# Altium footprint library CADTchip.PcbLib: 195 footprints (part 2 of 13)
Each footprint in its own frame and in the unit in brackets; x right, y up, seen from the top. Pads: shape width x height; smd on the part's side, far side on the other; paste and mask are expansions set on the pad; w line width, h text height; cw(c..) or ccw(c..) is an arc to the next point about the centre after c.
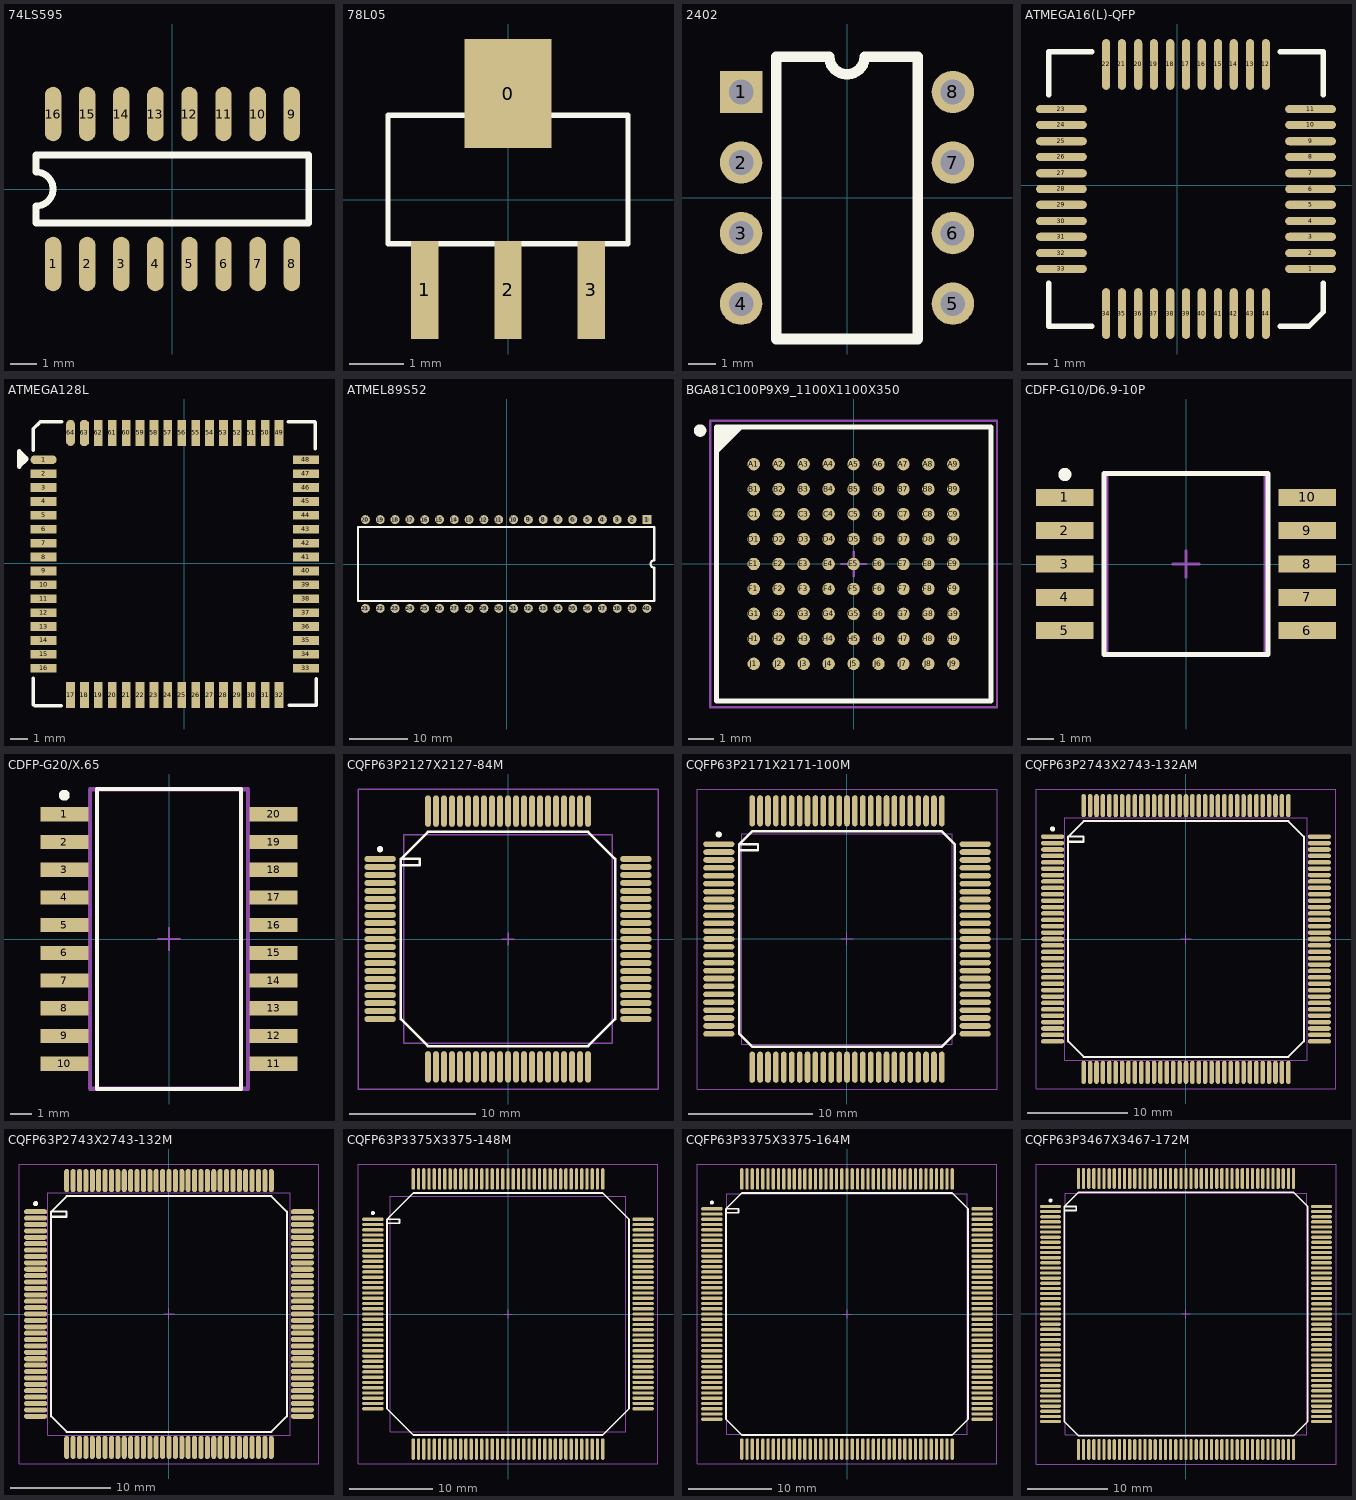
[diagram p1: the footprints below, top view; thin cyan lines are the x and y axes]

## 74LS595 [mil]
pads (16):
  oval 24x80 smd: 1(-175,-110) 2(-125,-110) 3(-75,-110) 4(-25,-110) 5(25,-110) 6(75,-110) 7(125,-110) 8(175,-110) 9(175,110) 10(125,110) 11(75,110) 12(25,110) 13(-25,110) 14(-75,110) 15(-125,110) 16(-175,110)
Top Overlay:
  lines w10: -200,-50 200,-50 200,50 -200,50 -200,25 cw(c-200,0) -200,-25 -200,-50

## 78L05 [mm]
pads (4):
  rect 1.6x2 smd: 0(-0.001,1.949)
  rect 0.5x1.8 smd: 1(-1.525,-1.651) 2(-0.001,-1.651) 3(1.523,-1.651)
Top Overlay:
  lines w0.1: -2.201,-0.801 2.199,-0.801 2.199,1.549 -2.201,1.549 -2.201,-0.801

## 2402 [mil] "DIP-8"
pads (8):
  rect 60x60 hole 35: 1(-150,150)
  round 60 hole 35: 2(-150,50) 3(-150,-50) 4(-150,-150) 5(150,-150) 6(150,-50) 7(150,50) 8(150,150)
Top Overlay:
  lines w15: -100,-200 100,-200 100,200 25,200 cw(c0,200) -25,200 -100,200 -100,-200

## ATMEGA16(L)-QFP [mil]
pads (44):
  oval 100x16 smd: 1(262.47,-164.14) 2(262.47,-133.14) 3(262.47,-101.14) 4(262.47,-70.14) 5(262.47,-38.14) 6(262.47,-7.14) 7(262.47,23.86) 8(262.47,55.86) 9(262.47,86.86) 10(262.47,118.86) 11(262.47,149.86) 23(-227.53,149.86) 24(-227.53,118.86) 25(-227.53,86.86) 26(-227.53,55.86) 27(-227.53,23.86) 28(-227.53,-7.14) 29(-227.53,-38.14) 30(-227.53,-70.14) 31(-227.53,-101.14) 32(-227.53,-133.14) 33(-227.53,-164.14)
  oval 16x100 smd: 12(174.47,237.86) 13(143.47,237.86) 14(111.47,237.86) 15(80.47,237.86) 16(48.47,237.86) 17(17.47,237.86) 18(-13.53,237.86) 19(-45.53,237.86) 20(-76.53,237.86) 21(-108.53,237.86) 22(-139.53,237.86) 34(-139.53,-252.14) 35(-108.53,-252.14) 36(-76.53,-252.14) 37(-45.53,-252.14) 38(-13.53,-252.14) 39(17.47,-252.14) 40(48.47,-252.14) 41(80.47,-252.14) 42(111.47,-252.14) 43(143.47,-252.14) 44(174.47,-252.14)
Top Overlay:
  lines w10: -252.53,-192.14 -252.53,-277.14 -167.53,-277.14 ; -252.53,177.86 -252.53,262.86 -167.53,262.86 ; 202.47,-277.14 259.47,-277.14 287.47,-249.14 287.47,-192.14 ; 202.47,262.86 287.47,262.86 287.47,177.86

## ATMEGA128L [mm]
pads (64):
  oval 1.5x0.5 smd: 1(-8.084,5.96)
  rect 1.5x0.5 smd: 2(-8.084,5.16) 3(-8.084,4.36) 4(-8.084,3.56) 5(-8.084,2.76) 6(-8.084,1.96) 7(-8.084,1.16) 8(-8.084,0.36) 9(-8.084,-0.44) 10(-8.084,-1.24) 11(-8.084,-2.04) 12(-8.084,-2.84) 13(-8.084,-3.64) 14(-8.084,-4.44) 15(-8.084,-5.24) 16(-8.084,-6.04) 33(7.016,-6.04) 34(7.016,-5.24) 35(7.016,-4.44) 36(7.016,-3.64) 37(7.016,-2.84) 38(7.016,-2.04) 39(7.016,-1.24) 40(7.016,-0.44) 41(7.016,0.36) 42(7.016,1.16) 43(7.016,1.96) 44(7.016,2.76) 45(7.016,3.56) 46(7.016,4.36) 47(7.016,5.16) 48(7.016,5.96)
  rect 0.5x1.5 smd: 17(-6.534,-7.59) 18(-5.734,-7.59) 19(-4.934,-7.59) 20(-4.134,-7.59) 21(-3.334,-7.59) 22(-2.534,-7.59) 23(-1.734,-7.59) 24(-0.934,-7.59) 25(-0.134,-7.59) 26(0.666,-7.59) 27(1.466,-7.59) 28(2.266,-7.59) 29(3.066,-7.59) 30(3.866,-7.59) 31(4.666,-7.59) 32(5.466,-7.59) 49(5.466,7.51) 50(4.666,7.51) 51(3.866,7.51) 52(3.066,7.51) 53(2.266,7.51) 54(1.466,7.51) 55(0.666,7.51) 56(-0.134,7.51) 57(-0.934,7.51) 58(-1.734,7.51) 59(-2.534,7.51) 60(-3.334,7.51) 61(-4.134,7.51) 62(-4.934,7.51)
  oct 0.5x1.5 smd: 63(-5.734,7.51)
  oval 0.5x1.5 smd: 64(-6.534,7.51)
Top Overlay:
  lines w0.2: -8.671,-8.131 -8.671,-6.606 ; -8.671,6.499 -8.671,7.749 ; -8.616,7.799 -8.341,8.074 ; -8.595,-8.207 -7.07,-8.207 ; -8.29,8.15 -7.04,8.15 ; 6.009,8.15 7.534,8.15 ; 6.06,-8.182 7.585,-8.182 ; 7.56,6.6 7.56,8.125 ; 7.61,-8.157 7.61,-6.632
  lines w0.254: -9.498,5.571 -9.077,5.991 ; -9.494,6.458 -9.073,6.037 ; -9.484,5.559 -9.484,6.457 ; -9.322,6.017 -9.154,6.017

## ATMEL89S52 [mil]
pads (40):
  rect 60x60 hole 33: 1(946.17,300)
  round 60 hole 33: 2(846.17,300) 3(746.17,300) 4(646.17,300) 5(546.17,300) 6(446.17,300) 7(346.17,300) 8(246.17,300) 9(146.17,300) 10(46.17,300) 11(-53.83,300) 12(-153.83,300) 13(-253.83,300) 14(-353.83,300) 15(-453.83,300) 16(-553.83,300) 17(-653.83,300) 18(-753.83,300) 19(-853.83,300) 20(-953.83,300) 21(-953.83,-300) 22(-853.83,-300) 23(-753.83,-300) 24(-653.83,-300) 25(-553.83,-300) 26(-453.83,-300) 27(-353.83,-300) 28(-253.83,-300) 29(-153.83,-300) 30(-53.83,-300) 31(46.17,-300) 32(146.17,-300) 33(246.17,-300) 34(346.17,-300) 35(446.17,-300) 36(546.17,-300) 37(646.17,-300) 38(746.17,-300) 39(846.17,-300) 40(946.17,-300)
Top Overlay:
  lines w15: -1003.83,-250 996.17,-250 996.17,-25 cw(c996.17,0) 996.17,25 996.17,250 -1003.83,250 -1003.83,-250

## BGA81C100P9X9_1100X1100X350 [mm] "BGA, 81-Leads, Body 11.0x11.0mm,  Pitch 1.00mm"
height 3.5
pads (81):
  round 0.5 smd: A1(-4,4) A2(-3,4) A3(-2,4) A4(-1,4) A5(0,4) A6(1,4) A7(2,4) A8(3,4) A9(4,4) B1(-4,3) B2(-3,3) B3(-2,3) B4(-1,3) B5(0,3) B6(1,3) B7(2,3) B8(3,3) B9(4,3) C1(-4,2) C2(-3,2) C3(-2,2) C4(-1,2) C5(0,2) C6(1,2) C7(2,2) C8(3,2) C9(4,2) D1(-4,1) D2(-3,1) D3(-2,1) D4(-1,1) D5(0,1) D6(1,1) D7(2,1) D8(3,1) D9(4,1) E1(-4,0) E2(-3,0) E3(-2,0) E4(-1,0) E5(0,0) E6(1,0) E7(2,0) E8(3,0) E9(4,0) F1(-4,-1) F2(-3,-1) F3(-2,-1) F4(-1,-1) F5(0,-1) F6(1,-1) F7(2,-1) F8(3,-1) F9(4,-1) G1(-4,-2) G2(-3,-2) G3(-2,-2) G4(-1,-2) G5(0,-2) G6(1,-2) G7(2,-2) G8(3,-2) G9(4,-2) H1(-4,-3) H2(-3,-3) H3(-2,-3) H4(-1,-3) H5(0,-3) H6(1,-3) H7(2,-3) H8(3,-3) H9(4,-3) J1(-4,-4) J2(-3,-4) J3(-2,-4) J4(-1,-4) J5(0,-4) J6(1,-4) J7(2,-4) J8(3,-4) J9(4,-4)
Top Overlay:
  circle w0.25: c-6.15,5.35 r0.125
  region: -4.5,5.5 -5.5,4.5 -5.5,5.5
  lines w0.2: -5.5,4.5 -4.5,5.5 ; -5.5,-5.5 -5.5,5.5 5.5,5.5 5.5,-5.5 -5.5,-5.5
Mechanical 13:
  lines w0.1: -5.5,-5.5 -5.5,5.5 5.5,5.5 5.5,-5.5 -5.5,-5.5
Mechanical 15:
  lines w0.1: -0.5,0 0.5,0 ; 0,-0.5 0,0.5 ; -5.75,-5.75 -5.75,5.75 5.75,5.75 5.75,-5.75 -5.75,-5.75
3D body: height 3.5, standoff 0.3, extent -5.5,-5.5 5.5,5.5

## CDFP-G10/D6.9-10P [mm] "DFP; 10 Leads; Body 6.9 x 6.9 mm (LxW max); Pitch 1.27 mm"
height 2.04
pads (10):
  rect 2.2x0.65 smd: 1(-4.625,2.54) 2(-4.625,1.27) 3(-4.625,0) 4(-4.625,-1.27) 5(-4.625,-2.54) 6(4.625,-2.54) 7(4.625,-1.27) 8(4.625,0) 9(4.625,1.27) 10(4.625,2.54)
Top Overlay:
  circle w0.25: c-4.625,3.415 r0.125
  lines w0.2: -3.125,-3.45 -3.125,3.45 3.125,3.45 3.125,-3.45 -3.125,-3.45
Mechanical 13:
  lines w0.1: -3,3.42 -3,-3.42 3,-3.42 3,3.42 ; -3,3.45 3,3.45
Mechanical 15:
  lines w0.1: -0.5,0 0.5,0 ; 0,-0.5 0,0.5
3D body: height 2.04, standoff 0.1, extent -3.05,-3.47 3.05,3.5

## CDFP-G20/X.65 [mm] "DFP; 20 Leads; Body 13.7 x 7.2 mm (LxW max); Pitch 1.27 mm"
height 2.29
pads (20):
  rect 2.2x0.65 smd: 1(-4.8,5.715) 2(-4.8,4.445) 3(-4.8,3.175) 4(-4.8,1.905) 5(-4.8,0.635) 6(-4.8,-0.635) 7(-4.8,-1.905) 8(-4.8,-3.175) 9(-4.8,-4.445) 10(-4.8,-5.715) 11(4.8,-5.715) 12(4.8,-4.445) 13(4.8,-3.175) 14(4.8,-1.905) 15(4.8,-0.635) 16(4.8,0.635) 17(4.8,1.905) 18(4.8,3.175) 19(4.8,4.445) 20(4.8,5.715)
Top Overlay:
  circle w0.25: c-4.8,6.59 r0.125
  lines w0.2: -3.3,-6.875 -3.3,6.875 3.3,6.875 3.3,-6.875 -3.3,-6.875
Mechanical 13:
  lines w0.2: -3.619,-6.858 -3.619,6.858 3.619,6.858 3.619,-6.858 -3.619,-6.858
Mechanical 15:
  lines w0.1: -0.5,0 0.5,0 ; 0,-0.5 0,0.5
3D body: height 2.29, standoff 0, extent -3.619,-6.857 3.619,6.857

## CQFP63P2127X2127-84M [mm] "CQFP, 84-Leads, Body 16.5x16.5mm; Pitch 0.635mm, Gullwing Leadform, IPC Low Density"
height 2.4
pads (84):
  oval 2.5x0.45 smd: 1(-10.15,6.35) 2(-10.15,5.715) 3(-10.15,5.08) 4(-10.15,4.445) 5(-10.15,3.81) 6(-10.15,3.175) 7(-10.15,2.54) 8(-10.15,1.905) 9(-10.15,1.27) 10(-10.15,0.635) 11(-10.15,0) 12(-10.15,-0.635) 13(-10.15,-1.27) 14(-10.15,-1.905) 15(-10.15,-2.54) 16(-10.15,-3.175) 17(-10.15,-3.81) 18(-10.15,-4.445) 19(-10.15,-5.08) 20(-10.15,-5.715) 21(-10.15,-6.35) 43(10.15,-6.35) 44(10.15,-5.715) 45(10.15,-5.08) 46(10.15,-4.445) 47(10.15,-3.81) 48(10.15,-3.175) 49(10.15,-2.54) 50(10.15,-1.905) 51(10.15,-1.27) 52(10.15,-0.635) 53(10.15,0) 54(10.15,0.635) 55(10.15,1.27) 56(10.15,1.905) 57(10.15,2.54) 58(10.15,3.175) 59(10.15,3.81) 60(10.15,4.445) 61(10.15,5.08) 62(10.15,5.715) 63(10.15,6.35)
  oval 0.45x2.5 smd: 22(-6.35,-10.15) 23(-5.715,-10.15) 24(-5.08,-10.15) 25(-4.445,-10.15) 26(-3.81,-10.15) 27(-3.175,-10.15) 28(-2.54,-10.15) 29(-1.905,-10.15) 30(-1.27,-10.15) 31(-0.635,-10.15) 32(0,-10.15) 33(0.635,-10.15) 34(1.27,-10.15) 35(1.905,-10.15) 36(2.54,-10.15) 37(3.175,-10.15) 38(3.81,-10.15) 39(4.445,-10.15) 40(5.08,-10.15) 41(5.715,-10.15) 42(6.35,-10.15) 64(6.35,10.15) 65(5.715,10.15) 66(5.08,10.15) 67(4.445,10.15) 68(3.81,10.15) 69(3.175,10.15) 70(2.54,10.15) 71(1.905,10.15) 72(1.27,10.15) 73(0.635,10.15) 74(0,10.15) 75(-0.635,10.15) 76(-1.27,10.15) 77(-1.905,10.15) 78(-2.54,10.15) 79(-3.175,10.15) 80(-3.81,10.15) 81(-4.445,10.15) 82(-5.08,10.15) 83(-5.715,10.15) 84(-6.35,10.15)
Top Overlay:
  circle w0.25: c-10.15,7.125 r0.125
  lines w0.2: -8.5,5.85 -7,5.85 -7,6.35 -8.5,6.35 ; -8.5,6.35 -6.35,8.5 6.35,8.5 8.5,6.35 8.5,-6.35 6.35,-8.5 -6.35,-8.5 -8.5,-6.35 -8.5,6.35
Mechanical 13:
  lines w0.1: -8.255,-8.255 8.255,-8.255 8.255,8.255 -8.255,8.255 -8.255,-8.255
Mechanical 15:
  lines w0.1: -0.5,0 0.5,0 ; 0,-0.5 0,0.5 ; -11.9,-11.9 11.9,-11.9 11.9,11.9 -11.9,11.9 -11.9,-11.9
3D body: height 2.4, standoff 0, extent -8.255,-8.255 8.255,8.255

## CQFP63P2171X2171-100M [mm] "100-Pin Ceramic Quad Flat Pack 0.635 mm Pitch"
height 3.2
pads (100):
  oval 2.5x0.45 smd: 1(-10.3,7.62) 2(-10.3,6.985) 3(-10.3,6.35) 4(-10.3,5.715) 5(-10.3,5.08) 6(-10.3,4.445) 7(-10.3,3.81) 8(-10.3,3.175) 9(-10.3,2.54) 10(-10.3,1.905) 11(-10.3,1.27) 12(-10.3,0.635) 13(-10.3,0) 14(-10.3,-0.635) 15(-10.3,-1.27) 16(-10.3,-1.905) 17(-10.3,-2.54) 18(-10.3,-3.175) 19(-10.3,-3.81) 20(-10.3,-4.445) 21(-10.3,-5.08) 22(-10.3,-5.715) 23(-10.3,-6.35) 24(-10.3,-6.985) 25(-10.3,-7.62) 51(10.3,-7.62) 52(10.3,-6.985) 53(10.3,-6.35) 54(10.3,-5.715) 55(10.3,-5.08) 56(10.3,-4.445) 57(10.3,-3.81) 58(10.3,-3.175) 59(10.3,-2.54) 60(10.3,-1.905) 61(10.3,-1.27) 62(10.3,-0.635) 63(10.3,0) 64(10.3,0.635) 65(10.3,1.27) 66(10.3,1.905) 67(10.3,2.54) 68(10.3,3.175) 69(10.3,3.81) 70(10.3,4.445) 71(10.3,5.08) 72(10.3,5.715) 73(10.3,6.35) 74(10.3,6.985) 75(10.3,7.62)
  oval 0.45x2.5 smd: 26(-7.62,-10.3) 27(-6.985,-10.3) 28(-6.35,-10.3) 29(-5.715,-10.3) 30(-5.08,-10.3) 31(-4.445,-10.3) 32(-3.81,-10.3) 33(-3.175,-10.3) 34(-2.54,-10.3) 35(-1.905,-10.3) 36(-1.27,-10.3) 37(-0.635,-10.3) 38(0,-10.3) 39(0.635,-10.3) 40(1.27,-10.3) 41(1.905,-10.3) 42(2.54,-10.3) 43(3.175,-10.3) 44(3.81,-10.3) 45(4.445,-10.3) 46(5.08,-10.3) 47(5.715,-10.3) 48(6.35,-10.3) 49(6.985,-10.3) 50(7.62,-10.3) 76(7.62,10.3) 77(6.985,10.3) 78(6.35,10.3) 79(5.715,10.3) 80(5.08,10.3) 81(4.445,10.3) 82(3.81,10.3) 83(3.175,10.3) 84(2.54,10.3) 85(1.905,10.3) 86(1.27,10.3) 87(0.635,10.3) 88(0,10.3) 89(-0.635,10.3) 90(-1.27,10.3) 91(-1.905,10.3) 92(-2.54,10.3) 93(-3.175,10.3) 94(-3.81,10.3) 95(-4.445,10.3) 96(-5.08,10.3) 97(-5.715,10.3) 98(-6.35,10.3) 99(-6.985,10.3) 100(-7.62,10.3)
Top Overlay:
  circle w0.25: c-10.3,8.395 r0.125
  lines w0.2: -8.65,7.12 -7.15,7.12 -7.15,7.62 -8.65,7.62 ; -8.65,7.62 -7.62,8.65 7.62,8.65 8.65,7.62 8.65,-7.62 7.62,-8.65 -7.62,-8.65 -8.65,-7.62 -8.65,7.62
Mechanical 13:
  lines w0.1: -8.475,-8.475 8.475,-8.475 8.475,8.475 -8.475,8.475 -8.475,-8.475
Mechanical 15:
  lines w0.1: -0.5,0 0.5,0 ; 0,-0.5 0,0.5 ; -12.05,-12.05 12.05,-12.05 12.05,12.05 -12.05,12.05 -12.05,-12.05
3D body: height 3.2, standoff 0, extent -8.475,-8.475 8.475,8.475

## CQFP63P2743X2743-132AM [mm] "CQFP, 132-Leads, Body 24x24mm; Pitch 0.635mm, Gullwing Leadform, IPC Low Density"
height 3
pads (132):
  oval 2.3x0.45 smd: 1(-13.25,10.16) 2(-13.25,9.525) 3(-13.25,8.89) 4(-13.25,8.255) 5(-13.25,7.62) 6(-13.25,6.985) 7(-13.25,6.35) 8(-13.25,5.715) 9(-13.25,5.08) 10(-13.25,4.445) 11(-13.25,3.81) 12(-13.25,3.175) 13(-13.25,2.54) 14(-13.25,1.905) 15(-13.25,1.27) 16(-13.25,0.635) 17(-13.25,0) 18(-13.25,-0.635) 19(-13.25,-1.27) 20(-13.25,-1.905) 21(-13.25,-2.54) 22(-13.25,-3.175) 23(-13.25,-3.81) 24(-13.25,-4.445) 25(-13.25,-5.08) 26(-13.25,-5.715) 27(-13.25,-6.35) 28(-13.25,-6.985) 29(-13.25,-7.62) 30(-13.25,-8.255) 31(-13.25,-8.89) 32(-13.25,-9.525) 33(-13.25,-10.16) 67(13.25,-10.16) 68(13.25,-9.525) 69(13.25,-8.89) 70(13.25,-8.255) 71(13.25,-7.62) 72(13.25,-6.985) 73(13.25,-6.35) 74(13.25,-5.715) 75(13.25,-5.08) 76(13.25,-4.445) 77(13.25,-3.81) 78(13.25,-3.175) 79(13.25,-2.54) 80(13.25,-1.905) 81(13.25,-1.27) 82(13.25,-0.635) 83(13.25,0) 84(13.25,0.635) 85(13.25,1.27) 86(13.25,1.905) 87(13.25,2.54) 88(13.25,3.175) 89(13.25,3.81) 90(13.25,4.445) 91(13.25,5.08) 92(13.25,5.715) 93(13.25,6.35) 94(13.25,6.985) 95(13.25,7.62) 96(13.25,8.255) 97(13.25,8.89) 98(13.25,9.525) 99(13.25,10.16)
  oval 0.45x2.3 smd: 34(-10.16,-13.25) 35(-9.525,-13.25) 36(-8.89,-13.25) 37(-8.255,-13.25) 38(-7.62,-13.25) 39(-6.985,-13.25) 40(-6.35,-13.25) 41(-5.715,-13.25) 42(-5.08,-13.25) 43(-4.445,-13.25) 44(-3.81,-13.25) 45(-3.175,-13.25) 46(-2.54,-13.25) 47(-1.905,-13.25) 48(-1.27,-13.25) 49(-0.635,-13.25) 50(0,-13.25) 51(0.635,-13.25) 52(1.27,-13.25) 53(1.905,-13.25) 54(2.54,-13.25) 55(3.175,-13.25) 56(3.81,-13.25) 57(4.445,-13.25) 58(5.08,-13.25) 59(5.715,-13.25) 60(6.35,-13.25) 61(6.985,-13.25) 62(7.62,-13.25) 63(8.255,-13.25) 64(8.89,-13.25) 65(9.525,-13.25) 66(10.16,-13.25) 100(10.16,13.25) 101(9.525,13.25) 102(8.89,13.25) 103(8.255,13.25) 104(7.62,13.25) 105(6.985,13.25) 106(6.35,13.25) 107(5.715,13.25) 108(5.08,13.25) 109(4.445,13.25) 110(3.81,13.25) 111(3.175,13.25) 112(2.54,13.25) 113(1.905,13.25) 114(1.27,13.25) 115(0.635,13.25) 116(0,13.25) 117(-0.635,13.25) 118(-1.27,13.25) 119(-1.905,13.25) 120(-2.54,13.25) 121(-3.175,13.25) 122(-3.81,13.25) 123(-4.445,13.25) 124(-5.08,13.25) 125(-5.715,13.25) 126(-6.35,13.25) 127(-6.985,13.25) 128(-7.62,13.25) 129(-8.255,13.25) 130(-8.89,13.25) 131(-9.525,13.25) 132(-10.16,13.25)
Top Overlay:
  circle w0.25: c-13.25,10.935 r0.125
  lines w0.2: -11.7,9.66 -10.2,9.66 -10.2,10.16 -11.7,10.16 ; -11.7,10.16 -10.16,11.7 10.16,11.7 11.7,10.16 11.7,-10.16 10.16,-11.7 -10.16,-11.7 -11.7,-10.16 -11.7,10.16
Mechanical 13:
  lines w0.1: -12.035,-12.035 12.035,-12.035 12.035,12.035 -12.035,12.035 -12.035,-12.035
Mechanical 15:
  lines w0.1: -0.5,0 0.5,0 ; 0,-0.5 0,0.5 ; -14.9,-14.9 14.9,-14.9 14.9,14.9 -14.9,14.9 -14.9,-14.9
3D body: height 3, standoff 0, extent -12.035,-12.035 12.035,12.035

## CQFP63P2743X2743-132M [mm] "CQFP, 132-Leads, Body 24x24mm; Pitch 0.635mm, Gullwing Leadform, IPC Low Density"
height 3.6
pads (132):
  oval 2.3x0.5 smd: 1(-13.25,10.16) 2(-13.25,9.525) 3(-13.25,8.89) 4(-13.25,8.255) 5(-13.25,7.62) 6(-13.25,6.985) 7(-13.25,6.35) 8(-13.25,5.715) 9(-13.25,5.08) 10(-13.25,4.445) 11(-13.25,3.81) 12(-13.25,3.175) 13(-13.25,2.54) 14(-13.25,1.905) 15(-13.25,1.27) 16(-13.25,0.635) 17(-13.25,0) 18(-13.25,-0.635) 19(-13.25,-1.27) 20(-13.25,-1.905) 21(-13.25,-2.54) 22(-13.25,-3.175) 23(-13.25,-3.81) 24(-13.25,-4.445) 25(-13.25,-5.08) 26(-13.25,-5.715) 27(-13.25,-6.35) 28(-13.25,-6.985) 29(-13.25,-7.62) 30(-13.25,-8.255) 31(-13.25,-8.89) 32(-13.25,-9.525) 33(-13.25,-10.16) 67(13.25,-10.16) 68(13.25,-9.525) 69(13.25,-8.89) 70(13.25,-8.255) 71(13.25,-7.62) 72(13.25,-6.985) 73(13.25,-6.35) 74(13.25,-5.715) 75(13.25,-5.08) 76(13.25,-4.445) 77(13.25,-3.81) 78(13.25,-3.175) 79(13.25,-2.54) 80(13.25,-1.905) 81(13.25,-1.27) 82(13.25,-0.635) 83(13.25,0) 84(13.25,0.635) 85(13.25,1.27) 86(13.25,1.905) 87(13.25,2.54) 88(13.25,3.175) 89(13.25,3.81) 90(13.25,4.445) 91(13.25,5.08) 92(13.25,5.715) 93(13.25,6.35) 94(13.25,6.985) 95(13.25,7.62) 96(13.25,8.255) 97(13.25,8.89) 98(13.25,9.525) 99(13.25,10.16)
  oval 0.5x2.3 smd: 34(-10.16,-13.25) 35(-9.525,-13.25) 36(-8.89,-13.25) 37(-8.255,-13.25) 38(-7.62,-13.25) 39(-6.985,-13.25) 40(-6.35,-13.25) 41(-5.715,-13.25) 42(-5.08,-13.25) 43(-4.445,-13.25) 44(-3.81,-13.25) 45(-3.175,-13.25) 46(-2.54,-13.25) 47(-1.905,-13.25) 48(-1.27,-13.25) 49(-0.635,-13.25) 50(0,-13.25) 51(0.635,-13.25) 52(1.27,-13.25) 53(1.905,-13.25) 54(2.54,-13.25) 55(3.175,-13.25) 56(3.81,-13.25) 57(4.445,-13.25) 58(5.08,-13.25) 59(5.715,-13.25) 60(6.35,-13.25) 61(6.985,-13.25) 62(7.62,-13.25) 63(8.255,-13.25) 64(8.89,-13.25) 65(9.525,-13.25) 66(10.16,-13.25) 100(10.16,13.25) 101(9.525,13.25) 102(8.89,13.25) 103(8.255,13.25) 104(7.62,13.25) 105(6.985,13.25) 106(6.35,13.25) 107(5.715,13.25) 108(5.08,13.25) 109(4.445,13.25) 110(3.81,13.25) 111(3.175,13.25) 112(2.54,13.25) 113(1.905,13.25) 114(1.27,13.25) 115(0.635,13.25) 116(0,13.25) 117(-0.635,13.25) 118(-1.27,13.25) 119(-1.905,13.25) 120(-2.54,13.25) 121(-3.175,13.25) 122(-3.81,13.25) 123(-4.445,13.25) 124(-5.08,13.25) 125(-5.715,13.25) 126(-6.35,13.25) 127(-6.985,13.25) 128(-7.62,13.25) 129(-8.255,13.25) 130(-8.89,13.25) 131(-9.525,13.25) 132(-10.16,13.25)
Top Overlay:
  circle w0.25: c-13.25,10.96 r0.125
  lines w0.2: -11.7,9.66 -10.2,9.66 -10.2,10.16 -11.7,10.16 ; -11.7,10.16 -10.16,11.7 10.16,11.7 11.7,10.16 11.7,-10.16 10.16,-11.7 -10.16,-11.7 -11.7,-10.16 -11.7,10.16
Mechanical 13:
  lines w0.1: -12.035,-12.035 12.035,-12.035 12.035,12.035 -12.035,12.035 -12.035,-12.035
Mechanical 15:
  lines w0.1: -0.5,0 0.5,0 ; 0,-0.5 0,0.5 ; -14.9,-14.9 14.9,-14.9 14.9,14.9 -14.9,14.9 -14.9,-14.9
3D body: height 3.6, standoff 0, extent -12.035,-12.035 12.035,12.035

## CQFP63P3375X3375-148M [mm] "CQFP, 148-Leads, Body 28.5x28.5mm; Pitch 0.635mm, Gullwing Leadform, IPC Low Density"
height 3.1
pads (148):
  oval 2.6x0.4 smd: 1(-16.3,11.43) 2(-16.3,10.795) 3(-16.3,10.16) 4(-16.3,9.525) 5(-16.3,8.89) 6(-16.3,8.255) 7(-16.3,7.62) 8(-16.3,6.985) 9(-16.3,6.35) 10(-16.3,5.715) 11(-16.3,5.08) 12(-16.3,4.445) 13(-16.3,3.81) 14(-16.3,3.175) 15(-16.3,2.54) 16(-16.3,1.905) 17(-16.3,1.27) 18(-16.3,0.635) 19(-16.3,0) 20(-16.3,-0.635) 21(-16.3,-1.27) 22(-16.3,-1.905) 23(-16.3,-2.54) 24(-16.3,-3.175) 25(-16.3,-3.81) 26(-16.3,-4.445) 27(-16.3,-5.08) 28(-16.3,-5.715) 29(-16.3,-6.35) 30(-16.3,-6.985) 31(-16.3,-7.62) 32(-16.3,-8.255) 33(-16.3,-8.89) 34(-16.3,-9.525) 35(-16.3,-10.16) 36(-16.3,-10.795) 37(-16.3,-11.43) 75(16.3,-11.43) 76(16.3,-10.795) 77(16.3,-10.16) 78(16.3,-9.525) 79(16.3,-8.89) 80(16.3,-8.255) 81(16.3,-7.62) 82(16.3,-6.985) 83(16.3,-6.35) 84(16.3,-5.715) 85(16.3,-5.08) 86(16.3,-4.445) 87(16.3,-3.81) 88(16.3,-3.175) 89(16.3,-2.54) 90(16.3,-1.905) 91(16.3,-1.27) 92(16.3,-0.635) 93(16.3,0) 94(16.3,0.635) 95(16.3,1.27) 96(16.3,1.905) 97(16.3,2.54) 98(16.3,3.175) 99(16.3,3.81) 100(16.3,4.445) 101(16.3,5.08) 102(16.3,5.715) 103(16.3,6.35) 104(16.3,6.985) 105(16.3,7.62) 106(16.3,8.255) 107(16.3,8.89) 108(16.3,9.525) 109(16.3,10.16) 110(16.3,10.795) 111(16.3,11.43)
  oval 0.4x2.6 smd: 38(-11.43,-16.3) 39(-10.795,-16.3) 40(-10.16,-16.3) 41(-9.525,-16.3) 42(-8.89,-16.3) 43(-8.255,-16.3) 44(-7.62,-16.3) 45(-6.985,-16.3) 46(-6.35,-16.3) 47(-5.715,-16.3) 48(-5.08,-16.3) 49(-4.445,-16.3) 50(-3.81,-16.3) 51(-3.175,-16.3) 52(-2.54,-16.3) 53(-1.905,-16.3) 54(-1.27,-16.3) 55(-0.635,-16.3) 56(0,-16.3) 57(0.635,-16.3) 58(1.27,-16.3) 59(1.905,-16.3) 60(2.54,-16.3) 61(3.175,-16.3) 62(3.81,-16.3) 63(4.445,-16.3) 64(5.08,-16.3) 65(5.715,-16.3) 66(6.35,-16.3) 67(6.985,-16.3) 68(7.62,-16.3) 69(8.255,-16.3) 70(8.89,-16.3) 71(9.525,-16.3) 72(10.16,-16.3) 73(10.795,-16.3) 74(11.43,-16.3) 112(11.43,16.3) 113(10.795,16.3) 114(10.16,16.3) 115(9.525,16.3) 116(8.89,16.3) 117(8.255,16.3) 118(7.62,16.3) 119(6.985,16.3) 120(6.35,16.3) 121(5.715,16.3) 122(5.08,16.3) 123(4.445,16.3) 124(3.81,16.3) 125(3.175,16.3) 126(2.54,16.3) 127(1.905,16.3) 128(1.27,16.3) 129(0.635,16.3) 130(0,16.3) 131(-0.635,16.3) 132(-1.27,16.3) 133(-1.905,16.3) 134(-2.54,16.3) 135(-3.175,16.3) 136(-3.81,16.3) 137(-4.445,16.3) 138(-5.08,16.3) 139(-5.715,16.3) 140(-6.35,16.3) 141(-6.985,16.3) 142(-7.62,16.3) 143(-8.255,16.3) 144(-8.89,16.3) 145(-9.525,16.3) 146(-10.16,16.3) 147(-10.795,16.3) 148(-11.43,16.3)
Top Overlay:
  circle w0.25: c-16.3,12.18 r0.125
  lines w0.2: -14.6,10.93 -13.1,10.93 -13.1,11.43 -14.6,11.43 ; -14.6,11.43 -14.6,-11.43 -11.43,-14.6 11.43,-14.6 14.6,-11.43 14.6,11.43 11.43,14.6 -11.43,14.6 -14.6,11.43
Mechanical 13:
  lines w0.1: -14.23,-14.23 -14.23,14.23 14.23,14.23 14.23,-14.23 -14.23,-14.23
Mechanical 15:
  lines w0.1: -0.5,0 0.5,0 ; 0,-0.5 0,0.5 ; -18.1,-18.1 -18.1,18.1 18.1,18.1 18.1,-18.1 -18.1,-18.1
3D body: height 3.1, standoff 0, extent -14.23,-14.23 14.23,14.23

## CQFP63P3375X3375-164M [mm] "CQFP, 164-Leads, Body 29x29mm; Pitch 0.635mm, Gullwing Leadform, IPC Low Density"
height 3.4
pads (164):
  oval 2.6x0.4 smd: 1(-16.3,12.7) 2(-16.3,12.065) 3(-16.3,11.43) 4(-16.3,10.795) 5(-16.3,10.16) 6(-16.3,9.525) 7(-16.3,8.89) 8(-16.3,8.255) 9(-16.3,7.62) 10(-16.3,6.985) 11(-16.3,6.35) 12(-16.3,5.715) 13(-16.3,5.08) 14(-16.3,4.445) 15(-16.3,3.81) 16(-16.3,3.175) 17(-16.3,2.54) 18(-16.3,1.905) 19(-16.3,1.27) 20(-16.3,0.635) 21(-16.3,0) 22(-16.3,-0.635) 23(-16.3,-1.27) 24(-16.3,-1.905) 25(-16.3,-2.54) 26(-16.3,-3.175) 27(-16.3,-3.81) 28(-16.3,-4.445) 29(-16.3,-5.08) 30(-16.3,-5.715) 31(-16.3,-6.35) 32(-16.3,-6.985) 33(-16.3,-7.62) 34(-16.3,-8.255) 35(-16.3,-8.89) 36(-16.3,-9.525) 37(-16.3,-10.16) 38(-16.3,-10.795) 39(-16.3,-11.43) 40(-16.3,-12.065) 41(-16.3,-12.7) 83(16.3,-12.7) 84(16.3,-12.065) 85(16.3,-11.43) 86(16.3,-10.795) 87(16.3,-10.16) 88(16.3,-9.525) 89(16.3,-8.89) 90(16.3,-8.255) 91(16.3,-7.62) 92(16.3,-6.985) 93(16.3,-6.35) 94(16.3,-5.715) 95(16.3,-5.08) 96(16.3,-4.445) 97(16.3,-3.81) 98(16.3,-3.175) 99(16.3,-2.54) 100(16.3,-1.905) 101(16.3,-1.27) 102(16.3,-0.635) 103(16.3,0) 104(16.3,0.635) 105(16.3,1.27) 106(16.3,1.905) 107(16.3,2.54) 108(16.3,3.175) 109(16.3,3.81) 110(16.3,4.445) 111(16.3,5.08) 112(16.3,5.715) 113(16.3,6.35) 114(16.3,6.985) 115(16.3,7.62) 116(16.3,8.255) 117(16.3,8.89) 118(16.3,9.525) 119(16.3,10.16) 120(16.3,10.795) 121(16.3,11.43) 122(16.3,12.065) 123(16.3,12.7)
  oval 0.4x2.6 smd: 42(-12.7,-16.3) 43(-12.065,-16.3) 44(-11.43,-16.3) 45(-10.795,-16.3) 46(-10.16,-16.3) 47(-9.525,-16.3) 48(-8.89,-16.3) 49(-8.255,-16.3) 50(-7.62,-16.3) 51(-6.985,-16.3) 52(-6.35,-16.3) 53(-5.715,-16.3) 54(-5.08,-16.3) 55(-4.445,-16.3) 56(-3.81,-16.3) 57(-3.175,-16.3) 58(-2.54,-16.3) 59(-1.905,-16.3) 60(-1.27,-16.3) 61(-0.635,-16.3) 62(0,-16.3) 63(0.635,-16.3) 64(1.27,-16.3) 65(1.905,-16.3) 66(2.54,-16.3) 67(3.175,-16.3) 68(3.81,-16.3) 69(4.445,-16.3) 70(5.08,-16.3) 71(5.715,-16.3) 72(6.35,-16.3) 73(6.985,-16.3) 74(7.62,-16.3) 75(8.255,-16.3) 76(8.89,-16.3) 77(9.525,-16.3) 78(10.16,-16.3) 79(10.795,-16.3) 80(11.43,-16.3) 81(12.065,-16.3) 82(12.7,-16.3) 124(12.7,16.3) 125(12.065,16.3) 126(11.43,16.3) 127(10.795,16.3) 128(10.16,16.3) 129(9.525,16.3) 130(8.89,16.3) 131(8.255,16.3) 132(7.62,16.3) 133(6.985,16.3) 134(6.35,16.3) 135(5.715,16.3) 136(5.08,16.3) 137(4.445,16.3) 138(3.81,16.3) 139(3.175,16.3) 140(2.54,16.3) 141(1.905,16.3) 142(1.27,16.3) 143(0.635,16.3) 144(0,16.3) 145(-0.635,16.3) 146(-1.27,16.3) 147(-1.905,16.3) 148(-2.54,16.3) 149(-3.175,16.3) 150(-3.81,16.3) 151(-4.445,16.3) 152(-5.08,16.3) 153(-5.715,16.3) 154(-6.35,16.3) 155(-6.985,16.3) 156(-7.62,16.3) 157(-8.255,16.3) 158(-8.89,16.3) 159(-9.525,16.3) 160(-10.16,16.3) 161(-10.795,16.3) 162(-11.43,16.3) 163(-12.065,16.3) 164(-12.7,16.3)
Top Overlay:
  circle w0.25: c-16.3,13.45 r0.125
  lines w0.2: -14.6,12.2 -13.1,12.2 -13.1,12.7 -14.6,12.7 ; -14.6,12.7 -12.7,14.6 12.7,14.6 14.6,12.7 14.6,-12.7 12.7,-14.6 -12.7,-14.6 -14.6,-12.7 -14.6,12.7
Mechanical 13:
  lines w0.1: -14.525,-14.525 14.525,-14.525 14.525,14.525 -14.525,14.525 -14.525,-14.525
Mechanical 15:
  lines w0.1: -0.5,0 0.5,0 ; 0,-0.5 0,0.5 ; -18.1,-18.1 18.1,-18.1 18.1,18.1 -18.1,18.1 -18.1,-18.1
3D body: height 3.4, standoff 0, extent -14.525,-14.525 14.525,14.525

## CQFP63P3467X3467-172M [mm] "CQFP, 172-Leads, Body 30x30mm; Pitch 0.635mm, Gullwing Leadform, IPC Low Density"
height 3
pads (172):
  oval 2.6x0.4 smd: 1(-16.8,13.335) 2(-16.8,12.7) 3(-16.8,12.065) 4(-16.8,11.43) 5(-16.8,10.795) 6(-16.8,10.16) 7(-16.8,9.525) 8(-16.8,8.89) 9(-16.8,8.255) 10(-16.8,7.62) 11(-16.8,6.985) 12(-16.8,6.35) 13(-16.8,5.715) 14(-16.8,5.08) 15(-16.8,4.445) 16(-16.8,3.81) 17(-16.8,3.175) 18(-16.8,2.54) 19(-16.8,1.905) 20(-16.8,1.27) 21(-16.8,0.635) 22(-16.8,0) 23(-16.8,-0.635) 24(-16.8,-1.27) 25(-16.8,-1.905) 26(-16.8,-2.54) 27(-16.8,-3.175) 28(-16.8,-3.81) 29(-16.8,-4.445) 30(-16.8,-5.08) 31(-16.8,-5.715) 32(-16.8,-6.35) 33(-16.8,-6.985) 34(-16.8,-7.62) 35(-16.8,-8.255) 36(-16.8,-8.89) 37(-16.8,-9.525) 38(-16.8,-10.16) 39(-16.8,-10.795) 40(-16.8,-11.43) 41(-16.8,-12.065) 42(-16.8,-12.7) 43(-16.8,-13.335) 87(16.8,-13.335) 88(16.8,-12.7) 89(16.8,-12.065) 90(16.8,-11.43) 91(16.8,-10.795) 92(16.8,-10.16) 93(16.8,-9.525) 94(16.8,-8.89) 95(16.8,-8.255) 96(16.8,-7.62) 97(16.8,-6.985) 98(16.8,-6.35) 99(16.8,-5.715) 100(16.8,-5.08) 101(16.8,-4.445) 102(16.8,-3.81) 103(16.8,-3.175) 104(16.8,-2.54) 105(16.8,-1.905) 106(16.8,-1.27) 107(16.8,-0.635) 108(16.8,0) 109(16.8,0.635) 110(16.8,1.27) 111(16.8,1.905) 112(16.8,2.54) 113(16.8,3.175) 114(16.8,3.81) 115(16.8,4.445) 116(16.8,5.08) 117(16.8,5.715) 118(16.8,6.35) 119(16.8,6.985) 120(16.8,7.62) 121(16.8,8.255) 122(16.8,8.89) 123(16.8,9.525) 124(16.8,10.16) 125(16.8,10.795) 126(16.8,11.43) 127(16.8,12.065) 128(16.8,12.7) 129(16.8,13.335)
  oval 0.4x2.6 smd: 44(-13.335,-16.8) 45(-12.7,-16.8) 46(-12.065,-16.8) 47(-11.43,-16.8) 48(-10.795,-16.8) 49(-10.16,-16.8) 50(-9.525,-16.8) 51(-8.89,-16.8) 52(-8.255,-16.8) 53(-7.62,-16.8) 54(-6.985,-16.8) 55(-6.35,-16.8) 56(-5.715,-16.8) 57(-5.08,-16.8) 58(-4.445,-16.8) 59(-3.81,-16.8) 60(-3.175,-16.8) 61(-2.54,-16.8) 62(-1.905,-16.8) 63(-1.27,-16.8) 64(-0.635,-16.8) 65(0,-16.8) 66(0.635,-16.8) 67(1.27,-16.8) 68(1.905,-16.8) 69(2.54,-16.8) 70(3.175,-16.8) 71(3.81,-16.8) 72(4.445,-16.8) 73(5.08,-16.8) 74(5.715,-16.8) 75(6.35,-16.8) 76(6.985,-16.8) 77(7.62,-16.8) 78(8.255,-16.8) 79(8.89,-16.8) 80(9.525,-16.8) 81(10.16,-16.8) 82(10.795,-16.8) 83(11.43,-16.8) 84(12.065,-16.8) 85(12.7,-16.8) 86(13.335,-16.8) 130(13.335,16.8) 131(12.7,16.8) 132(12.065,16.8) 133(11.43,16.8) 134(10.795,16.8) 135(10.16,16.8) 136(9.525,16.8) 137(8.89,16.8) 138(8.255,16.8) 139(7.62,16.8) 140(6.985,16.8) 141(6.35,16.8) 142(5.715,16.8) 143(5.08,16.8) 144(4.445,16.8) 145(3.81,16.8) 146(3.175,16.8) 147(2.54,16.8) 148(1.905,16.8) 149(1.27,16.8) 150(0.635,16.8) 151(0,16.8) 152(-0.635,16.8) 153(-1.27,16.8) 154(-1.905,16.8) 155(-2.54,16.8) 156(-3.175,16.8) 157(-3.81,16.8) 158(-4.445,16.8) 159(-5.08,16.8) 160(-5.715,16.8) 161(-6.35,16.8) 162(-6.985,16.8) 163(-7.62,16.8) 164(-8.255,16.8) 165(-8.89,16.8) 166(-9.525,16.8) 167(-10.16,16.8) 168(-10.795,16.8) 169(-11.43,16.8) 170(-12.065,16.8) 171(-12.7,16.8) 172(-13.335,16.8)
Top Overlay:
  circle w0.25: c-16.8,14.085 r0.125
  lines w0.2: -15.1,12.835 -13.6,12.835 -13.6,13.335 -15.1,13.335 ; -15.1,13.335 -13.335,15.1 13.335,15.1 15.1,13.335 15.1,-13.335 13.335,-15.1 -13.335,-15.1 -15.1,-13.335 -15.1,13.335
Mechanical 13:
  lines w0.1: -14.985,-14.985 14.985,-14.985 14.985,14.985 -14.985,14.985 -14.985,-14.985
Mechanical 15:
  lines w0.1: -0.5,0 0.5,0 ; 0,-0.5 0,0.5 ; -18.6,-18.6 18.6,-18.6 18.6,18.6 -18.6,18.6 -18.6,-18.6
3D body: height 3, standoff 0, extent -14.985,-14.985 14.985,14.985